# Altium footprint library E-Stall_lib.PcbLib: 112 footprints (part 5 of 7)
Each footprint in its own frame and in the unit in brackets; x right, y up, seen from the top. Pads: shape width x height; smd on the part's side, far side on the other; paste and mask are expansions set on the pad; w line width, h text height; cw(c..) or ccw(c..) is an arc to the next point about the centre after c.
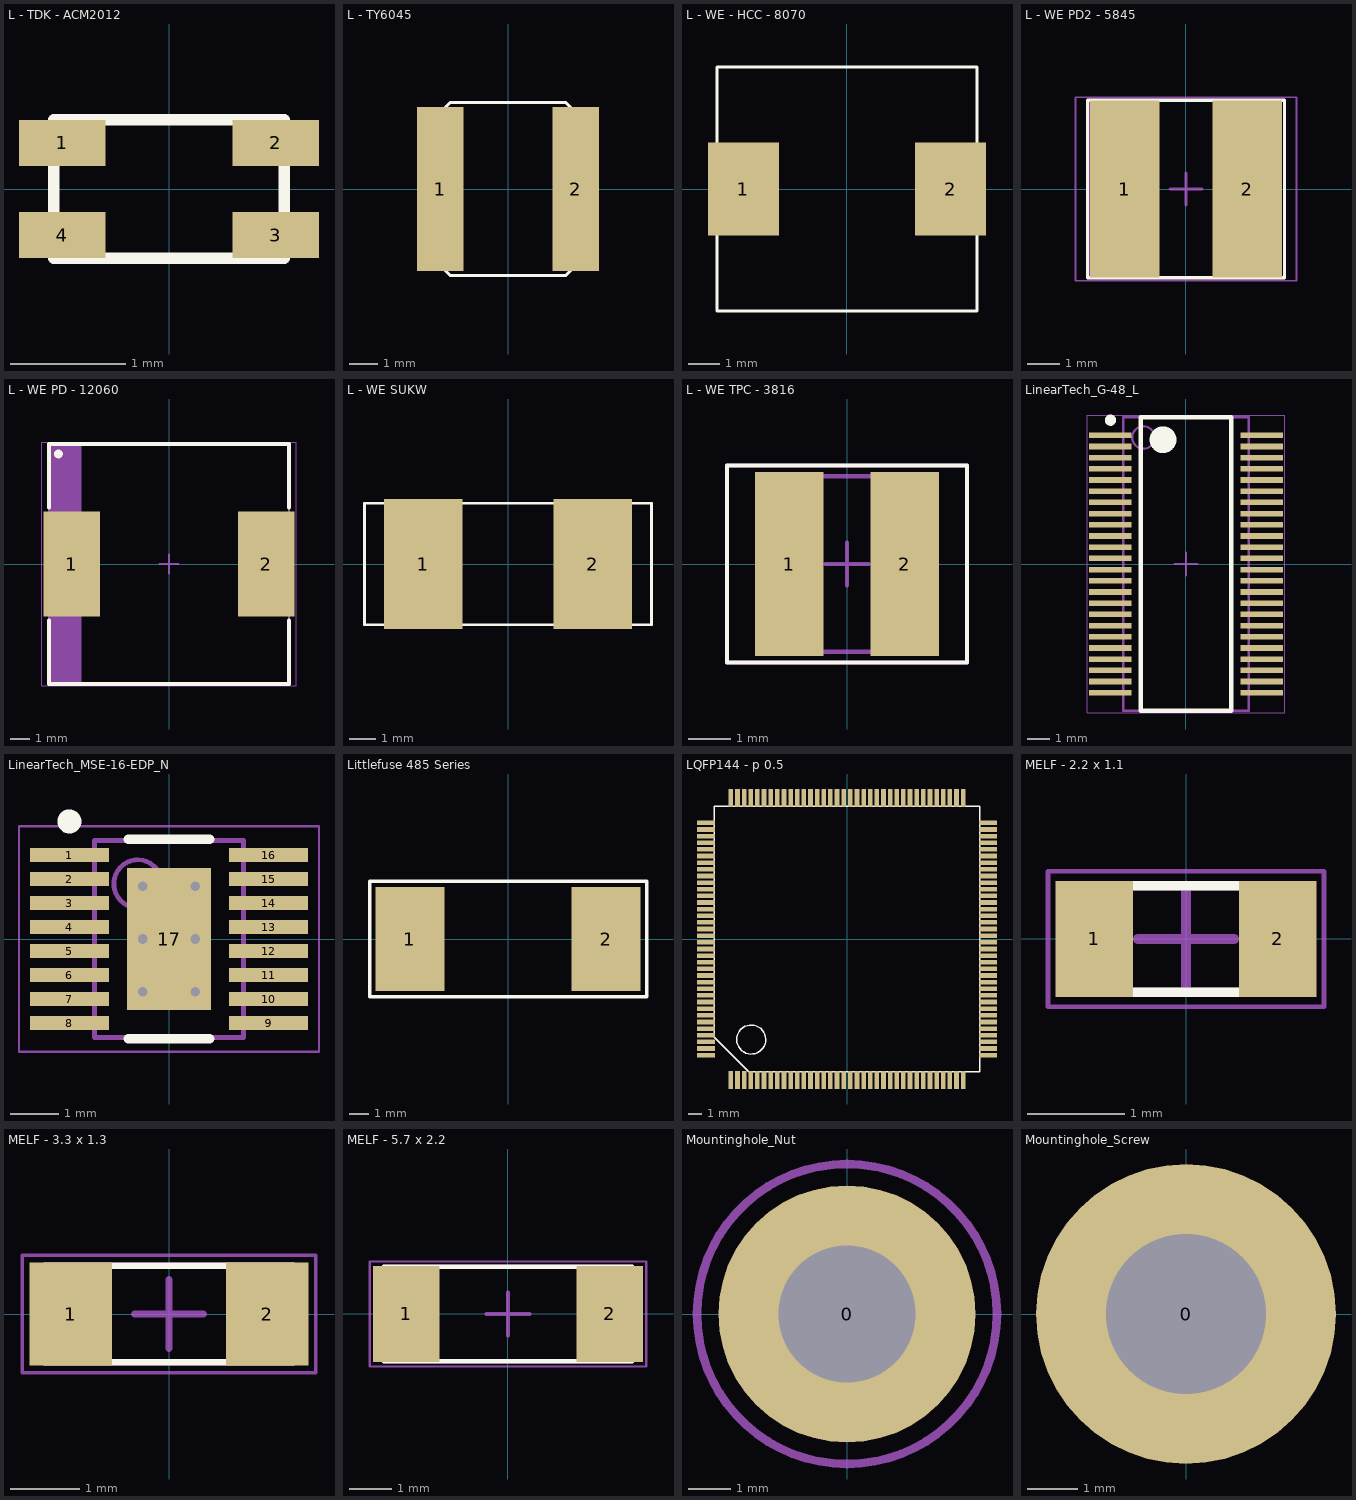
[diagram p4: the footprints below, top view; thin cyan lines are the x and y axes]

## L - TDK - ACM2012 [mm]
pads (4):
  rect 0.75x0.4 smd mask+0.07: 1(-0.925,0.4) 2(0.925,0.4) 3(0.925,-0.4) 4(-0.925,-0.4)
Top Overlay:
  lines w0.1: -1,-0.6 0,-0.6 1,-0.6 1,0 1,0.6 0,0.6 -1,0.6 -1,0 -1,-0.6
3D body "L -  TDK - ACM2012.STEP": height 1.31, standoff 0.01, extent -1,-0.6 1,0.6

## L - TY6045 [mm]
height 4.5
pads (2):
  rect 1.6x5.7 smd mask+0.05: 1(-2.35,0) 2(2.35,0)
Top Overlay:
  lines w0.1: -3,-2 -3,0 -3,2 -2,3 0,3 2,3 3,2 3,0 3,-2 2,-3 0,-3 -2,-3 -3,-2
Mechanical 1:
  lines w0.1: -3,-1.995 -1.995,-3 1.995,-3 3,-1.995 3,1.995 1.995,3 -2.01,3 -3,2.01 -3,1.935 -3,-1.995
3D body: height 4.5, standoff 0, extent -3.001,-3.001 3.001,3.001

## L - WE - HCC - 8070 [mm]
pads (2):
  rect 2.3x3 smd: 1(-3.35,0) 2(3.35,0)
Top Overlay:
  lines w0.1: -4.2,-3.95 4.2,-3.95 4.2,3.95 -4.2,3.95 -4.2,-3.95
3D body "L - WE - 7443340330.stp": height 7.16, standoff -0.04, extent -4.2,-3.95 4.2,3.95

## L - WE PD2 - 5845 [mm] "Precision Wire Wound Inductor, 2-Leads, Body 5,80x5,20mm, IPC High Density"
height 4.85
pads (2):
  rect 2.15x5.5 smd: 1(-1.9,0) 2(1.9,0)
Top Overlay:
  circle w0.254: c-2.8,2.475 r0.025
  lines w0.1: -3.05,-2.75 -3.05,2.75 3.05,2.75 3.05,-2.75 -3.05,-2.75
Mechanical 13:
  rectangle: -3.05,-2.75 -2.23,2.75
  lines w0.1: -3.05,-2.75 -3.05,2.75 3.05,2.75 3.05,-2.75 -3.05,-2.75
Mechanical 15:
  lines w0.05: -3.425,-2.85 -3.425,2.85 3.425,2.85 3.425,-2.85 -3.425,-2.85
  lines w0.1: -0.5,0 0.5,0 ; 0,-0.5 0,0.5
3D body "L - WE - PD2-5848.stp": height 4.5, standoff 0, extent -2.899,-2.6 2.889,2.6

## L - WE PD - 12060 [mm] "Precision Wire Wound Inductor, 2-Leads, Body 12,00x12,00mm, IPC High Density"
height 6
pads (2):
  rect 2.9x5.4 smd: 1(-5,0) 2(5,0)
Top Overlay:
  circle w0.25: c-5.675,5.65 r0.1
  lines w0.2: -6.15,-2.9 -6.15,-6.15 6.15,-6.15 6.15,-2.9 ; -6.15,2.9 -6.15,6.15 6.15,6.15 6.15,2.9
Mechanical 13:
  rectangle: -6.15,-6.15 -4.496,6.15
  lines w0.1: -6.15,-6.15 -6.15,6.15 6.15,6.15 6.15,-6.15 -6.15,-6.15
Mechanical 15:
  lines w0.05: -6.525,-6.25 -6.525,6.25 6.525,6.25 6.525,-6.25 -6.525,-6.25
  lines w0.1: -0.5,0 0.5,0 ; 0,-0.5 0,0.5
3D body "WE-PD-1260.stp": height 6.01, standoff 0.01, extent -6,-6 6,6

## L - WE SUKW [mm]
pads (2):
  rect 3x5 smd mask+0.07: 1(-3.25,0) 2(3.25,0)
Top Overlay:
  lines w0.1: -5.5,-2.325 0,-2.325 5.5,-2.325 5.5,0 5.5,2.325 0,2.325 -5.5,2.325 -5.5,0 -5.5,-2.325
3D body "L-WE-SUKW - 7427512 (rev1).stp": height 5.2, standoff -0.05, extent -5.5,-2.325 5.5,2.325

## L - WE TPC - 3816 [mm]
pads (2):
  rect 1.6x4.3 smd: 1(-1.35,0) 2(1.35,0)
Top Overlay:
  lines w0.1: -2.8,-2.3 -2.8,2.3 2.8,2.3 2.8,-2.3 -2.8,-2.3
Mechanical 13:
  lines w0.1: -2.05,-2.05 2.05,-2.05 2.05,2.05 -2.05,2.05 -2.05,-2.05
Mechanical 15:
  lines w0.1: -0.5,0 0.5,0 ; 0,-0.5 0,0.5 ; -2.8,-2.3 2.8,-2.3 2.8,2.3 -2.8,2.3 -2.8,-2.3
3D body "744031470.stp": height 1.64, standoff -0.01, extent -1.9,-1.9 1.9,1.9

## LinearTech_G-48_L [mm] "SOP, 48-Leads, Body 13.1x5.6mm, Pitch 0.5mm, IPC High Density"
height 2
pads (48):
  rect 1.9x0.25 smd: 1(-3.375,5.75) 2(-3.375,5.25) 3(-3.375,4.75) 4(-3.375,4.25) 5(-3.375,3.75) 6(-3.375,3.25) 7(-3.375,2.75) 8(-3.375,2.25) 9(-3.375,1.75) 10(-3.375,1.25) 11(-3.375,0.75) 12(-3.375,0.25) 13(-3.375,-0.25) 14(-3.375,-0.75) 15(-3.375,-1.25) 16(-3.375,-1.75) 17(-3.375,-2.25) 18(-3.375,-2.75) 19(-3.375,-3.25) 20(-3.375,-3.75) 21(-3.375,-4.25) 22(-3.375,-4.75) 23(-3.375,-5.25) 24(-3.375,-5.75) 25(3.375,-5.75) 26(3.375,-5.25) 27(3.375,-4.75) 28(3.375,-4.25) 29(3.375,-3.75) 30(3.375,-3.25) 31(3.375,-2.75) 32(3.375,-2.25) 33(3.375,-1.75) 34(3.375,-1.25) 35(3.375,-0.75) 36(3.375,-0.25) 37(3.375,0.25) 38(3.375,0.75) 39(3.375,1.25) 40(3.375,1.75) 41(3.375,2.25) 42(3.375,2.75) 43(3.375,3.25) 44(3.375,3.75) 45(3.375,4.25) 46(3.375,4.75) 47(3.375,5.25) 48(3.375,5.75)
Top Overlay:
  circle w0.6: c-1.025,5.55 r0.3
  circle w0.25: c-3.375,6.425 r0.125
  lines w0.2: -2.025,-6.55 2.025,-6.55 2.025,6.55 -2.025,6.55 -2.025,-6.55
Mechanical 13:
  circle w0.1: c-1.9,5.65 r0.5
  lines w0.1: -2.8,-6.55 2.8,-6.55 2.8,6.55 -2.8,6.55 -2.8,-6.55
Mechanical 15:
  lines w0.05: -4.4,-6.65 4.4,-6.65 4.4,6.65 -4.4,6.65 -4.4,-6.65
  lines w0.1: -0.5,0 0.5,0 ; 0,-0.5 0,0.5
3D body: height 2, standoff 0.05, extent -2.8,-6.55 2.8,6.55

## LinearTech_MSE-16-EDP_N [mm] "SOP, 16-Leads, Body 4.1x3.1mm, Pitch 0.5mm, Thermal Pad 2.95x1.76mm, IPC Medium Density"
height 1.1
pads (17):
  rect 1.65x0.3 smd: 1(-2.075,1.75) 2(-2.075,1.25) 3(-2.075,0.75) 4(-2.075,0.25) 5(-2.075,-0.25) 6(-2.075,-0.75) 7(-2.075,-1.25) 8(-2.075,-1.75) 9(2.075,-1.75) 10(2.075,-1.25) 11(2.075,-0.75) 12(2.075,-0.25) 13(2.075,0.25) 14(2.075,0.75) 15(2.075,1.25) 16(2.075,1.75)
  rect 1.76x2.95 smd: 17(0,0)
via 0.55,-1.1 diameter 0.5 hole 0.2
via -0.55,-1.1 diameter 0.5 hole 0.2
via 0.55,0 diameter 0.5 hole 0.2
via -0.55,0 diameter 0.5 hole 0.2
via 0.55,1.1 diameter 0.5 hole 0.2
via -0.55,1.1 diameter 0.5 hole 0.2
Top Overlay:
  circle w0.25: c-2.075,2.45 r0.125
  lines w0.2: -0.851,-2.075 0.851,-2.075 ; -0.851,2.075 0.851,2.075
Mechanical 13:
  circle w0.1: c-0.65,1.15 r0.5
  lines w0.1: -1.55,-2.05 1.55,-2.05 1.55,2.05 -1.55,2.05 -1.55,-2.05
Mechanical 15:
  lines w0.05: -3.125,-2.35 3.125,-2.35 3.125,2.35 -3.125,2.35 -3.125,-2.35
  lines w0.1: -0.5,0 0.5,0 ; 0,-0.5 0,0.5
3D body: height 1.1, standoff 0.05, extent -1.55,-2.05 1.55,2.05

## Littlefuse 485 Series [mm]
pads (2):
  rect 3.5x5.3 smd: 1(-5,0) 2(5,0)
Top Overlay:
  lines w0.2: -7.05,-2.939 -7.05,2.95 7.075,2.95 7.075,-2.939 -7.05,-2.939
3D body "Part3.stp": height 4.51, standoff 0.01, extent -6.025,-2.25 5.975,2.25

## LQFP144 - p 0.5 [mm]
pads (144):
  rect 0.35x1.35 smd mask+0.05: 1(-8.75,-10.625) 2(-8.25,-10.625) 3(-7.75,-10.625) 4(-7.25,-10.625) 5(-6.75,-10.625) 6(-6.25,-10.625) 7(-5.75,-10.625) 8(-5.25,-10.625) 9(-4.75,-10.625) 10(-4.25,-10.625) 11(-3.75,-10.625) 12(-3.25,-10.625) 13(-2.75,-10.625) 14(-2.25,-10.625) 15(-1.75,-10.625) 16(-1.25,-10.625) 17(-0.75,-10.625) 18(-0.25,-10.625) 19(0.25,-10.625) 20(0.75,-10.625) 21(1.25,-10.625) 22(1.75,-10.625) 23(2.25,-10.625) 24(2.75,-10.625) 25(3.25,-10.625) 26(3.75,-10.625) 27(4.25,-10.625) 28(4.75,-10.625) 29(5.25,-10.625) 30(5.75,-10.625) 31(6.25,-10.625) 32(6.75,-10.625) 33(7.25,-10.625) 34(7.75,-10.625) 35(8.25,-10.625) 36(8.75,-10.625) 73(8.75,10.625) 74(8.25,10.625) 75(7.75,10.625) 76(7.25,10.625) 77(6.75,10.625) 78(6.25,10.625) 79(5.75,10.625) 80(5.25,10.625) 81(4.75,10.625) 82(4.25,10.625) 83(3.75,10.625) 84(3.25,10.625) 85(2.75,10.625) 86(2.25,10.625) 87(1.75,10.625) 88(1.25,10.625) 89(0.75,10.625) 90(0.25,10.625) 91(-0.25,10.625) 92(-0.75,10.625) 93(-1.25,10.625) 94(-1.75,10.625) 95(-2.25,10.625) 96(-2.75,10.625) 97(-3.25,10.625) 98(-3.75,10.625) 99(-4.25,10.625) 100(-4.75,10.625) 101(-5.25,10.625) 102(-5.75,10.625) 103(-6.25,10.625) 104(-6.75,10.625) 105(-7.25,10.625) 106(-7.75,10.625) 107(-8.25,10.625) 108(-8.75,10.625)
  rect 1.35x0.35 smd mask+0.05: 37(10.625,-8.75) 38(10.625,-8.25) 39(10.625,-7.75) 40(10.625,-7.25) 41(10.625,-6.75) 42(10.625,-6.25) 43(10.625,-5.75) 44(10.625,-5.25) 45(10.625,-4.75) 46(10.625,-4.25) 47(10.625,-3.75) 48(10.625,-3.25) 49(10.625,-2.75) 50(10.625,-2.25) 51(10.625,-1.75) 52(10.625,-1.25) 53(10.625,-0.75) 54(10.625,-0.25) 55(10.625,0.25) 56(10.625,0.75) 57(10.625,1.25) 58(10.625,1.75) 59(10.625,2.25) 60(10.625,2.75) 61(10.625,3.25) 62(10.625,3.75) 63(10.625,4.25) 64(10.625,4.75) 65(10.625,5.25) 66(10.625,5.75) 67(10.625,6.25) 68(10.625,6.75) 69(10.625,7.25) 70(10.625,7.75) 71(10.625,8.25) 72(10.625,8.75) 109(-10.625,8.75) 110(-10.625,8.25) 111(-10.625,7.75) 112(-10.625,7.25) 113(-10.625,6.75) 114(-10.625,6.25) 115(-10.625,5.75) 116(-10.625,5.25) 117(-10.625,4.75) 118(-10.625,4.25) 119(-10.625,3.75) 120(-10.625,3.25) 121(-10.625,2.75) 122(-10.625,2.25) 123(-10.625,1.75) 124(-10.625,1.25) 125(-10.625,0.75) 126(-10.625,0.25) 127(-10.625,-0.25) 128(-10.625,-0.75) 129(-10.625,-1.25) 130(-10.625,-1.75) 131(-10.625,-2.25) 132(-10.625,-2.75) 133(-10.625,-3.25) 134(-10.625,-3.75) 135(-10.625,-4.25) 136(-10.625,-4.75) 137(-10.625,-5.25) 138(-10.625,-5.75) 139(-10.625,-6.25) 140(-10.625,-6.75) 141(-10.625,-7.25) 142(-10.625,-7.75) 143(-10.625,-8.25) 144(-10.625,-8.75)
Top Overlay:
  lines w0.1: -6.121,-7.528 ccw(c-7.215,-7.575) -6.12,-7.545 ; -10,-7.4 -10,0 -10,10 0,10 10,10 10,0 10,-10 0,-10 -7.4,-10 -10,-7.4
3D body "TSQFP50P2200X2200X160-144L.step": height 1.6, standoff 0, extent -11,-11 11,11

## MELF - 2.2 x 1.1 [mm] "MELF Resistor, 2-Leads, Body 2,15x1,05mm, IPC High Density"
height 1.1
pads (2):
  rect 0.8x1.2 smd: 1(-0.95,0) 2(0.95,0)
Top Overlay:
  lines w0.1: -1.1,-0.55 1.1,-0.55 1.1,0.55 -1.1,0.55 -1.1,-0.55
Mechanical 13:
  lines w0.1: -1.1,-0.55 -1.1,0.55 1.1,0.55 1.1,-0.55 -1.1,-0.55
Mechanical 15:
  lines w0.05: -1.425,-0.7 -1.425,0.7 1.425,0.7 1.425,-0.7 -1.425,-0.7
  lines w0.1: -0.5,0 0.5,0 ; 0,-0.5 0,0.5
3D body "RESMELF2211L.step": height 1.05, standoff 0, extent -1.075,-0.524 1.075,0.524

## MELF - 3.3 x 1.3 [mm] "MELF Resistor, 2-Leads, Body 3,50x1,35mm, IPC High Density"
height 1.4
pads (2):
  rect 1.2x1.5 smd: 1(-1.425,0) 2(1.425,0)
Top Overlay:
  lines w0.1: -1.8,-0.7 -1.8,0.7 1.8,0.7 1.8,-0.7 -1.8,-0.7
Mechanical 13:
  lines w0.1: -1.8,-0.7 1.8,-0.7 1.8,0.7 -1.8,0.7 -1.8,-0.7
Mechanical 15:
  lines w0.05: -2.125,-0.85 2.125,-0.85 2.125,0.85 -2.125,0.85 -2.125,-0.85
  lines w0.1: -0.5,0 0.5,0 ; 0,-0.5 0,0.5
3D body "RESMELF3513L.step": height 1.35, standoff 0.01, extent -1.75,-0.674 1.75,0.674

## MELF - 5.7 x 2.2 [mm] "MELF Resistor, 2-Leads, Body 5,73x2,10mm, IPC High Density"
height 2.2
pads (2):
  rect 1.55x2.25 smd: 1(-2.375,0) 2(2.375,0)
Top Overlay:
  lines w0.1: -2.9,-1.1 -2.9,1.1 2.9,1.1 2.9,-1.1 -2.9,-1.1
Mechanical 13:
  lines w0.1: -2.9,-1.1 2.9,-1.1 2.9,1.1 -2.9,1.1 -2.9,-1.1
Mechanical 15:
  lines w0.05: -3.225,-1.225 3.225,-1.225 3.225,1.225 -3.225,1.225 -3.225,-1.225
  lines w0.1: -0.5,0 0.5,0 ; 0,-0.5 0,0.5
3D body "RESMELF5721L.step": height 2.1, standoff 0.01, extent -2.863,-1.048 2.863,1.048

## Mountinghole_Nut [mm] "Hole with 3D Model of DIN 985 Locknut +Keepout for Wera Nut driver"
pads (1):
  round 6 hole 3.2: 0(0,0)
Mechanical 11:
  circle w0.2: c0,0 r3.5
3D body "Sicherungsmutter DIN 985 M3.stp": height 3.85, standoff 0, extent -2.75,-3.175 2.75,3.176

## Mountinghole_Screw [mm] "Hole with 3D Model of Würth WE-SCRW M3x4mm"
pads (1):
  round 6 hole 3.2: 0(0,0)
3D body "97790403211_Download_STP_97790403211_rev1.stp": height 2.09, standoff -4, extent -2.75,-2.75 2.75,2.75